# Altium footprint library 金属膜电容.PcbLib: 38 footprints (part 3 of 3)
Each footprint in its own frame and in the unit in brackets; x right, y up, seen from the top. Pads: shape width x height; smd on the part's side, far side on the other; paste and mask are expansions set on the pad; w line width, h text height; cw(c..) or ccw(c..) is an arc to the next point about the centre after c.
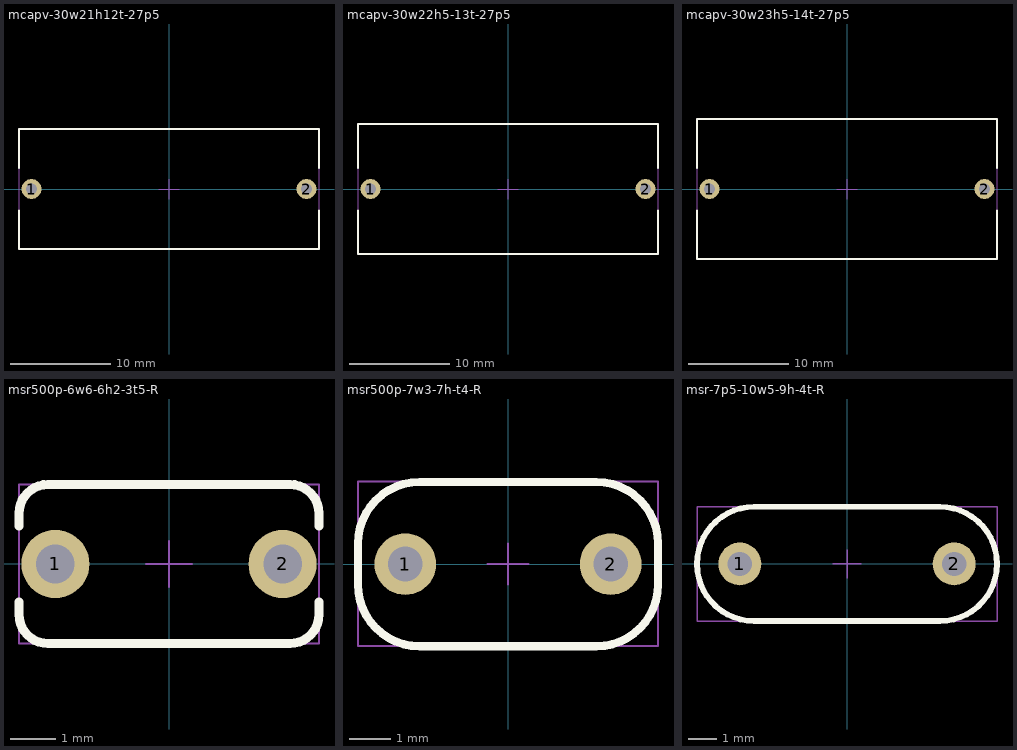
[diagram p2: the footprints below, top view; thin cyan lines are the x and y axes]

## mcapv-30w21h12t-27p5 [mm] "金属化薄膜电容"
height 11.5
pads (2):
  round 2 hole 1.1: 1(-13.75,0) 2(13.75,0)
Top Overlay:
  lines w0.2: -15,-2.125 -15,-6 15,-6 15,-2.125 ; -15,2.125 -15,6.001 15,6.001 15,2.125
Mechanical 13:
  lines w0.05: -15,-6 15,-6 15,6.001 -15,6.001 -15,-6
Mechanical 15:
  lines w0.1: -1,0 1,0 ; 0,-1 0,1
3D body: height 22, standoff -4, extent -15,-6 15,6.001

## mcapv-30w22h5-13t-27p5 [mm] "金属化薄膜电容"
height 13
pads (2):
  round 2 hole 1.1: 1(-13.75,0) 2(13.75,0)
Top Overlay:
  lines w0.2: -15,-2.125 -15,-6.5 15,-6.5 15,-2.125 ; -15,2.125 -15,6.501 15,6.501 15,2.125
Mechanical 13:
  lines w0.05: -15,-6.5 -15,6.501 15,6.501 15,-6.5 -15,-6.5
Mechanical 15:
  lines w0.1: -1,0 1,0 ; 0,-1 0,1
3D body: height 23.25, standoff -4.25, extent -15,-6.5 15,6.501

## mcapv-30w23h5-14t-27p5 [mm] "金属化薄膜电容"
height 13
pads (2):
  round 2 hole 1.1: 1(-13.75,0) 2(13.75,0)
Top Overlay:
  lines w0.2: -15,-2.125 -15,-7 15,-7 15,-2.125 ; -15,2.125 -15,7.001 15,7.001 15,2.125
Mechanical 13:
  lines w0.05: -15,-7 15,-7 15,7.001 -15,7.001 -15,-7
Mechanical 15:
  lines w0.1: -1,0 1,0 ; 0,-1 0,1
3D body: height 24.75, standoff -3.75, extent -15,-7 15,7.001

## msr500p-6w6-6h2-3t5-R [mm] "小型金属化聚酯薄膜电容"
height 11
pads (2):
  round 1.5 hole 0.85: 1(-2.5,0) 2(2.5,0)
Top Overlay:
  lines w0.2: -3.3,-0.838 -3.3,-1.115 ccw(c-2.665,-1.115) -2.665,-1.75 2.665,-1.75 ccw(c2.665,-1.115) 3.3,-1.115 3.3,-0.838 ; -3.3,0.838 -3.3,1.115 cw(c-2.665,1.115) -2.665,1.75 2.665,1.75 cw(c2.665,1.115) 3.3,1.115 3.3,0.838
Mechanical 13:
  lines w0.05: -3.3,-1.751 3.3,-1.751 3.3,1.75 -3.3,1.75 -3.3,-1.751
Mechanical 15:
  lines w0.05: -0.5,0 0.5,0 ; 0,-0.5 0,0.5
3D body: height 10.6, standoff -4.14, extent -3.3,-1.751 3.3,1.75

## msr500p-7w3-7h-t4-R [mm] "小型金属化聚酯薄膜电容"
height 12
pads (2):
  round 1.5 hole 0.85: 1(-2.5,0) 2(2.5,0)
Top Overlay:
  lines w0.2: -3.65,-0.5 ccw(c-2.15,-0.5) -2.15,-2 2.15,-2 ccw(c2.15,-0.5) 3.65,-0.5 3.65,0.5 ccw(c2.15,0.5) 2.15,2 -2.15,2 ccw(c-2.15,0.5) -3.65,0.5 -3.65,-0.5
Mechanical 13:
  lines w0.05: -3.65,-1.997 3.65,-1.997 3.65,2.007 -3.65,2.007 -3.65,-1.997
Mechanical 15:
  lines w0.05: -0.5,0 0.5,0 ; 0,-0.5 0,0.5
3D body: height 11.5, standoff -4.04, extent -3.65,-1.997 3.65,2.007

## msr-7p5-10w5-9h-4t-R [mm] "小型金属化聚酯薄膜电容"
height 14
pads (2):
  round 1.5 hole 0.85: 1(-3.75,0) 2(3.75,0)
Top Overlay:
  lines w0.2: -3.25,-2 cw(c-3.25,0) -3.25,2 3.25,2 cw(c3.25,0) 3.25,-2 -3.25,-2
Mechanical 13:
  lines w0.05: -5.25,-2.005 -5.25,2 5.25,2 5.25,-2.005 -5.25,-2.005
Mechanical 15:
  lines w0.05: -0.5,0 0.5,0 ; 0,-0.5 0,0.5
3D body: height 13.5, standoff -4.04, extent -5.25,-2.005 5.25,2